# Altium footprint library Connectors.PcbLib: 131 footprints (part 9 of 9)
Each footprint in its own frame and in the unit in brackets; x right, y up, seen from the top. Pads: shape width x height; smd on the part's side, far side on the other; paste and mask are expansions set on the pad; w line width, h text height; cw(c..) or ccw(c..) is an arc to the next point about the centre after c.
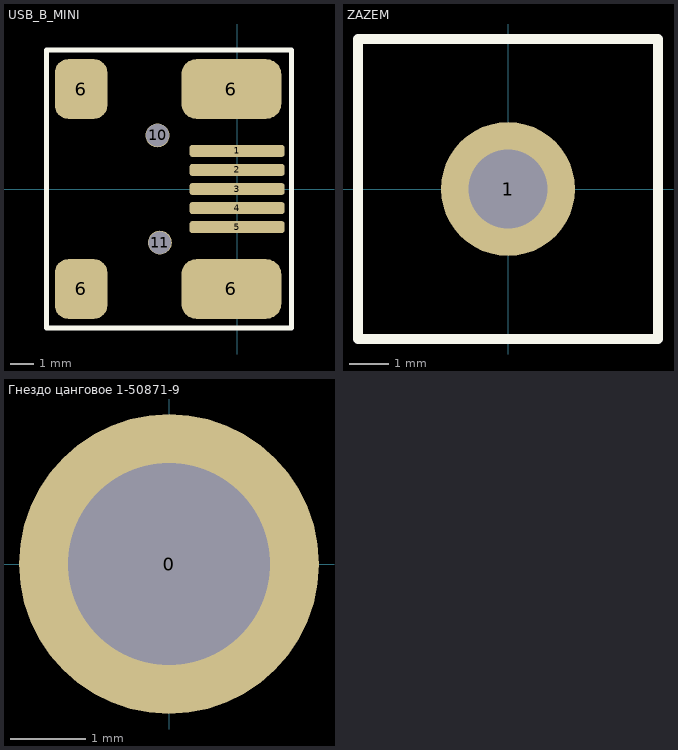
[diagram p8: the footprints below, top view; thin cyan lines are the x and y axes]

## USB_B_MINI [mm]
pads (11):
  rrect50% 4x0.5 smd: 1(0,1.6) 2(0,0.8) 3(0,0) 4(0,-0.8) 5(0,-1.6)
  rrect50% 2.2x2.5 smd: 6(-6.55,-4.2) 6(-6.55,4.2)
  rrect50% 4.2x2.5 smd: 6(-0.24,-4.2) 6(-0.24,4.2)
  round 1 hole 0.95 unplated: 10(-3.34,2.25) 11(-3.24,-2.25)
Top Overlay:
  lines w0.2: -8.001,-5.842 -8.001,5.842 2.286,5.842 2.286,-5.842 -8.001,-5.842
Top Assembly:
  text ".Designator" at 1.516,-0.333 h1
3D body "SW3dPS-USB_mini_B.STEP": height 3.95, standoff -1, extent -9.35,-5.35 -0.15,5.35

## ZAZEM [mm]
pads (1):
  round 3.4 hole 2: 1(0,0)
Top Overlay:
  lines w0.254: -3.81,-3.81 -3.81,3.81 3.81,3.81 3.81,-3.81 -3.81,-3.81
Top Assembly:
  text ".Designator" at 4.998,-0.333 h1

## Гнездо цанговое 1-50871-9 [mm]
pads (1):
  round 4 / inner round 4 / far side round 2.7 hole 2.7 unplated: 0(0,0)
Top Assembly:
  text ".Designator" at -4.998,-0.333 h1
3D body "Гнездо цанговое 1-50871-9.STEP": height 0.52, standoff -6.8, extent -1.499,-1.498 1.499,1.5